# Altium footprint library myPcbLib.PcbLib: 987 footprints (part 8 of 62)
Each footprint in its own frame and in the unit in brackets; x right, y up, seen from the top. Pads: shape width x height; smd on the part's side, far side on the other; paste and mask are expansions set on the pad; w line width, h text height; cw(c..) or ccw(c..) is an arc to the next point about the centre after c.
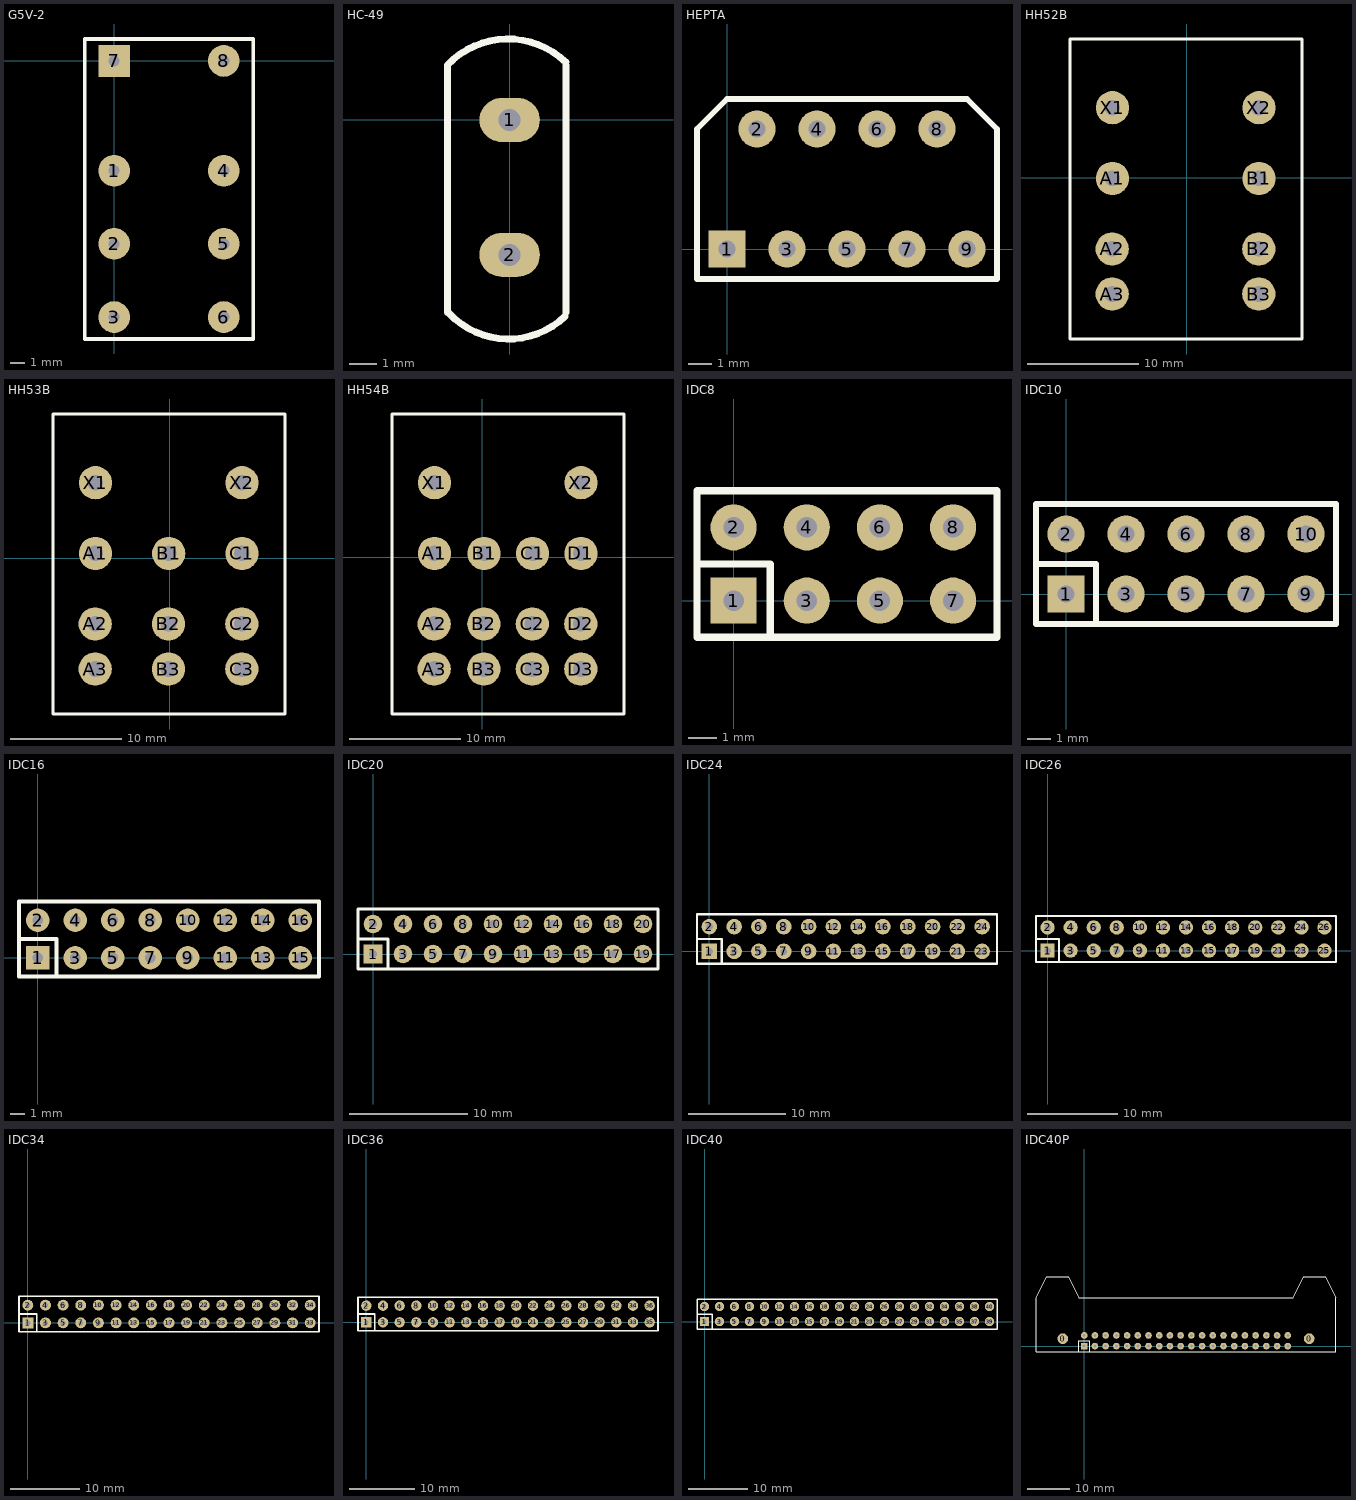
[diagram p7: the footprints below, top view; thin cyan lines are the x and y axes]

## G5V-2 [mm]
pads (8):
  round 2.2 hole 0.76: 1(0,-7.62) 2(0,-12.7) 3(0,-17.78) 4(7.62,-7.62) 5(7.62,-12.7) 6(7.62,-17.78) 8(7.62,0)
  rect 2.2x2.2 hole 0.76: 7(0,0)
Top Overlay:
  lines w0.254: -2.032,-19.304 -2.032,1.524 9.652,1.524 9.652,-17.78 9.652,-18.796 9.652,-19.304 -2.032,-19.304

## HC-49 [mm]
pads (2):
  oval 2.2x1.6 hole 0.8: 1(0,0) 2(0,-4.9)
Top Overlay:
  lines w0.254: -2.26,-7 -2.26,2 cw(c-0.06,-0.1) 2.04,2.1 ; -2.19,-7.04 ccw(c-0.04,-4.99) 2.01,-7.14 ; 2.04,-7 2.04,2

## HEPTA [mil]
pads (9):
  rect 62x62 hole 28: 1(0,0)
  round 62 hole 28: 2(50,200) 3(100,0) 4(150,200) 5(200,0) 6(250,200) 7(300,0) 8(350,200) 9(400,0)
Top Overlay:
  lines w10: -50,-50 -50,200 0,250 400,250 450,200 450,-50 -50,-50

## HH52B [mm] "HH52B"
height 35
pads (8):
  round 3 hole 1.4: A1(-6.688,-0.084) A2(-6.708,-6.436) A3(-6.708,-10.5) B1(6.52,-0.084) B2(6.5,-6.436) B3(6.5,-10.5) X1(-6.688,6.288) X2(6.52,6.288)
Top Overlay:
  lines w0.254: -10.524,12.408 -10.524,-14.556 10.408,-14.556 10.408,12.408 ; -10.524,12.484 10.408,12.484

## HH53B [mm] "HH53B"
height 35
pads (11):
  round 3 hole 1.4: A1(-6.688,0.416) A2(-6.708,-5.936) A3(-6.708,-10) B1(-0.084,0.416) B2(-0.104,-5.936) B3(-0.104,-10) C1(6.52,0.416) C2(6.5,-5.936) C3(6.5,-10) X1(-6.688,6.788) X2(6.52,6.788)
Top Overlay:
  lines w0.254: -10.524,12.908 -10.524,-14.056 10.408,-14.056 10.408,12.908 ; -10.524,12.984 10.408,12.984

## HH54B [mm] "HH54B"
height 35
pads (14):
  round 3 hole 1.4: A1(-4.32,0.352) A2(-4.34,-6) A3(-4.34,-10.064) B1(0.152,0.352) B2(0.132,-6) B3(0.132,-10.064) C1(4.52,0.352) C2(4.5,-6) C3(4.5,-10.064) D1(8.888,0.352) D2(8.868,-6) D3(8.868,-10.064) X1(-4.32,6.724) X2(8.888,6.724)
Top Overlay:
  lines w0.254: -8.156,12.844 -8.156,-14.12 12.776,-14.12 12.776,12.844 ; -8.156,12.92 12.776,12.92

## IDC8 [mm]
pads (8):
  rect 1.6x1.6 hole 0.711: 1(0,0)
  round 1.6 hole 0.711: 2(0,2.54) 3(2.54,0) 4(2.54,2.54) 5(5.08,0) 6(5.08,2.54) 7(7.62,0) 8(7.62,2.54)
Top Overlay:
  lines w0.254: -1.27,1.27 1.27,1.27 1.27,-1.27 ; -1.27,-1.27 9.144,-1.27 9.144,3.81 -1.27,3.81 -1.27,-1.27

## IDC10 [mil]
pads (10):
  rect 62x62 hole 28: 1(0,0)
  round 62 hole 28: 2(0,100) 3(100,0) 4(100,100) 5(200,0) 6(200,100) 7(300,0) 8(300,100) 9(400,0) 10(400,100)
Top Overlay:
  lines w10: -50,50 50,50 50,-50 ; -50,-50 450,-50 450,150 -50,150 -50,-50

## IDC16 [mil]
pads (16):
  rect 62x62 hole 28: 1(0,0)
  round 62 hole 28: 2(0,100) 3(100,0) 4(100,100) 5(200,0) 6(200,100) 7(300,0) 8(300,100) 9(400,0) 10(400,100) 11(500,0) 12(500,100) 13(600,0) 14(600,100) 15(700,0) 16(700,100)
Top Overlay:
  lines w10: -50,50 50,50 50,-50 ; -50,-50 750,-50 750,150 -50,150 -50,-50

## IDC20 [mil]
pads (20):
  rect 62x62 hole 28: 1(0,0)
  round 62 hole 28: 2(0,100) 3(100,0) 4(100,100) 5(200,0) 6(200,100) 7(300,0) 8(300,100) 9(400,0) 10(400,100) 11(500,0) 12(500,100) 13(600,0) 14(600,100) 15(700,0) 16(700,100) 17(800,0) 18(800,100) 19(900,0) 20(900,100)
Top Overlay:
  lines w10: -50,50 50,50 50,-50 ; -50,-50 -50,150 950,150 950,-50 -50,-50

## IDC24 [mm]
pads (24):
  rect 1.6x1.6 hole 0.711: 1(0,0)
  round 1.6 hole 0.711: 2(0,2.54) 3(2.54,0) 4(2.54,2.54) 5(5.08,0) 6(5.08,2.54) 7(7.62,0) 8(7.62,2.54) 9(10.16,0) 10(10.16,2.54) 11(12.7,0) 12(12.7,2.54) 13(15.24,0) 14(15.24,2.54) 15(17.78,0) 16(17.78,2.54) 17(20.32,0) 18(20.32,2.54) 19(22.86,0) 20(22.86,2.54) 21(25.4,0) 22(25.4,2.54) 23(27.94,0) 24(27.94,2.54)
Top Overlay:
  lines w0.254: -1.27,1.27 1.27,1.27 1.27,-1.27 ; -1.27,-1.27 -1.27,3.81 29.464,3.81 29.464,-1.27 -1.27,-1.27

## IDC26 [mil]
pads (26):
  rect 62x62 hole 28: 1(0,0)
  round 62 hole 28: 2(0,100) 3(100,0) 4(100,100) 5(200,0) 6(200,100) 7(300,0) 8(300,100) 9(400,0) 10(400,100) 11(500,0) 12(500,100) 13(600,0) 14(600,100) 15(700,0) 16(700,100) 17(800,0) 18(800,100) 19(900,0) 20(900,100) 21(1000,0) 22(1000,100) 23(1100,0) 24(1100,100) 25(1200,0) 26(1200,100)
Top Overlay:
  lines w10: -50,50 50,50 50,-50 ; -50,-50 1250,-50 1250,150 -50,150 -50,-50

## IDC34 [mil]
pads (34):
  rect 62x62 hole 28: 1(0,0)
  round 62 hole 28: 2(0,100) 3(100,0) 4(100,100) 5(200,0) 6(200,100) 7(300,0) 8(300,100) 9(400,0) 10(400,100) 11(500,0) 12(500,100) 13(600,0) 14(600,100) 15(700,0) 16(700,100) 17(800,0) 18(800,100) 19(900,0) 20(900,100) 21(1000,0) 22(1000,100) 23(1100,0) 24(1100,100) 25(1200,0) 26(1200,100) 27(1300,0) 28(1300,100) 29(1400,0) 30(1400,100) 31(1500,0) 32(1500,100) 33(1600,0) 34(1600,100)
Top Overlay:
  lines w10: -50,50 50,50 50,-50 ; -50,-50 1650,-50 1650,150 -50,150 -50,-50

## IDC36 [mil]
pads (36):
  rect 62x62 hole 28: 1(0,0)
  round 62 hole 28: 2(0,100) 3(100,0) 4(100,100) 5(200,0) 6(200,100) 7(300,0) 8(300,100) 9(400,0) 10(400,100) 11(500,0) 12(500,100) 13(600,0) 14(600,100) 15(700,0) 16(700,100) 17(800,0) 18(800,100) 19(900,0) 20(900,100) 21(1000,0) 22(1000,100) 23(1100,0) 24(1100,100) 25(1200,0) 26(1200,100) 27(1300,0) 28(1300,100) 29(1400,0) 30(1400,100) 31(1500,0) 32(1500,100) 33(1600,0) 34(1600,100) 35(1700,0) 36(1700,100)
Top Overlay:
  lines w10: -50,50 50,50 50,-50 ; -50,-50 -50,150 1750,150 1750,-50 -50,-50

## IDC40 [mil]
pads (40):
  rect 62x62 hole 28: 1(0,0)
  round 62 hole 28: 2(0,100) 3(100,0) 4(100,100) 5(200,0) 6(200,100) 7(300,0) 8(300,100) 9(400,0) 10(400,100) 11(500,0) 12(500,100) 13(600,0) 14(600,100) 15(700,0) 16(700,100) 17(800,0) 18(800,100) 19(900,0) 20(900,100) 21(1000,0) 22(1000,100) 23(1100,0) 24(1100,100) 25(1200,0) 26(1200,100) 27(1300,0) 28(1300,100) 29(1400,0) 30(1400,100) 31(1500,0) 32(1500,100) 33(1600,0) 34(1600,100) 35(1700,0) 36(1700,100) 37(1800,0) 38(1800,100) 39(1900,0) 40(1900,100)
Top Overlay:
  lines w10: -50,50 50,50 50,-50 ; -50,-50 -50,150 1950,150 1950,-50 -50,-50

## IDC40P [mil]
pads (42):
  round 100 hole 28: 0(-200,70) 0(2100,70)
  rect 62x62 hole 28: 1(0,0)
  round 62 hole 28: 2(0,100) 3(100,0) 4(100,100) 5(200,0) 6(200,100) 7(300,0) 8(300,100) 9(400,0) 10(400,100) 11(500,0) 12(500,100) 13(600,0) 14(600,100) 15(700,0) 16(700,100) 17(800,0) 18(800,100) 19(900,0) 20(900,100) 21(1000,0) 22(1000,100) 23(1100,0) 24(1100,100) 25(1200,0) 26(1200,100) 27(1300,0) 28(1300,100) 29(1400,0) 30(1400,100) 31(1500,0) 32(1500,100) 33(1600,0) 34(1600,100) 35(1700,0) 36(1700,100) 37(1800,0) 38(1800,100) 39(1900,0) 40(1900,100)
Top Overlay:
  lines w10: -50,-50 -50,50 50,50 50,-50 ; -450,-50 -450,450 -350,650 -150,650 -50,450 1950,450 2050,650 2250,650 2350,450 2350,-50 -450,-50